# Altium integrated library Connector-SIL-THP.IntLib: 464 symbols (part 2 of 2)
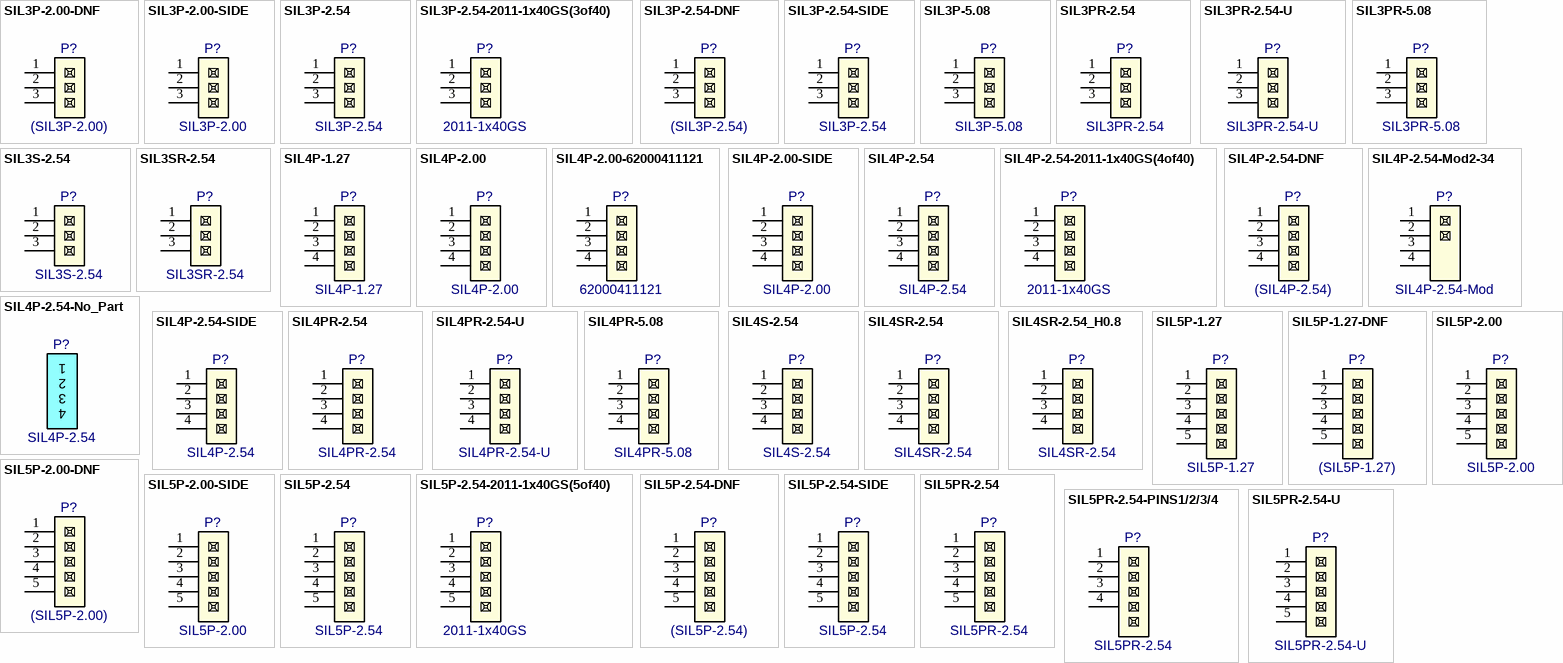
[diagram p12: symbols SIL3P-2.00-DNF to SIL5PR-2.54-U]

## SIL3SR-2.54
designator P?
Header SIL Female THP, 2.54mm Pitch Rt Angle; Manufacturer: Various; Package: SIL3SR-2.54; EDM-PN: *; Text2: *; Text1: *; Value: SIL3SR-2.54; SAAB PN: *; Part Number: SIL3SR-2.54
footprint SIL3SR-2.54 (SIL Strip Female 7.63x8.08mm 2.54mm)
pins: 1, 2, 3

## SIL4P-1.27
designator P?
Header SIL Male THP, 1.27mm Pitch; Manufacturer: Various; EDM-PN: CON459 (4 of 20); Package: SIL4P-1.27; Text2: *; Text1: *; Value: SIL4P-1.27; SAAB PN: *; Part Number: SIL4P-1.27
footprint SIL4P-1.27
pins: 1, 2, 3, 4

## SIL4P-2.00
designator P?
Header SIL Male THP, 2.00mm Pitch; Manufacturer: Various; Package: SIL4P-2.00; EDM-PN: *; Text2: *; Text1: *; Value: SIL4P-2.00; SAAB PN: *; Part Number: SIL4P-2.00
footprint SIL4P-2.00 (SIL4P 8.0x2.0mm)
pins: 1, 2, 3, 4

## SIL4P-2.00-62000411121
designator P?, comment 62000411121
Header SIL Male THP, 2.00mm Pitch; Manufacturer: Wurth; Package: 62000411121; EDM-PN: *; Text2: *; Text1: *; Value: 62000411121; SAAB PN: *; Part Number: 62000411121
footprint 62000411121 (SIL4P 8.0x2.0mm)
pins: 1, 2, 3, 4

## SIL4P-2.00-SIDE
designator P?  Part Number: SIL4P-2.00  (hidden comment: SIL4P-2.00-SIDE)
Header SIL Male THP, 2.00mm Pitch; Manufacturer: Various; Package: SIL4P-2.00-SIDE; EDM-PN: *; Text2: *; Text1: *; Value: SIL4P-2.00; SAAB PN: *
footprint SIL4P-2.00-SIDE (SIL4P 8.0x2.0mm)
pins: 1, 2, 3, 4

## SIL4P-2.54
designator P?
Header SIL Male THP, 2.54mm Pitch; Manufacturer: Various; EDM-PN: CON12; Package: SIL4P-2.54; Text2: *; Text1: *; Part Number: SIL4P-2.54; SAAB PN: *; Value: SIL4P-2.54
footprint SIL4P-2.54 (SIL Strip 2.54mm)
pins: 1, 2, 3, 4

## SIL4P-2.54-2011-1x40GS(4of40)
designator P?, comment Part Number: 2011-1x40GS  (hidden comment: 2011-1x40GS(4of40))
Header SIL Male THP, 2.54mm Pitch; Manufacturer: Protronix; EDM-PN: CON12; Package: SIL4P-2.54; Text2: *; Text1: *; SAAB PN: *; Value: 2011-1x40GS(4of40)
footprint SIL4P-2.54 (SIL Strip 2.54mm)
pins: 1, 2, 3, 4

## SIL4P-2.54-DNF
designator P?  value (SIL4P-2.54)  (hidden comment: SIL4P-2.54-DNF)
Header SIL Male THP, 2.54mm Pitch - Do not Fit; Manufacturer: Various; Part Number: DNF - SIL4P-2.54; EDM-PN: DNF; Package: SIL4P-2.54; Text2: *; Text1: *; SAAB PN: *
footprint SIL4P-2.54 (SIL Strip 2.54mm)
pins: 1, 2, 3, 4

## SIL4P-2.54-Mod2-34
designator P?, comment value SIL4P-2.54-Mod  (hidden comment: -Mod2-4)
Header SIL Male THP, 2.54mm Pitch - Mod; Manufacturer: Various; Part Number: SIL4P-2.54-Mod2-34; EDM-PN: CON12; Package: SIL4P-2.54; Text2: *; Text1: *; SAAB PN: *
footprint SIL4P-2.54-Mod2-34 (SIL Strip 2.54mm)
pins: 1, 2, 3, 4

## SIL4P-2.54-No_Part
designator P?, comment SIL4P-2.54  (mechanical)
Header SIL Male THP, 2.54mm Pitch; Manufacturer: Various; EDM-PN: CON12; Package: *; Text2: *; Text1: *; Part Number: SIL4P-2.54; SAAB PN: *; Value: SIL4P-2.54
text: 1; 2; 3; 4

## SIL4P-2.54-SIDE
designator P?  value SIL4P-2.54  (hidden comment: SIL4P-2.54-SIDE)
Header SIL Male THP, 2.54mm Pitch; Manufacturer: Various; EDM-PN: CON12; Package: SIL4P-2.54-SIDE; Text2: *; Text1: *; Part Number: SIL4P-2.54; SAAB PN: *
footprint SIL4P-2.54-EDGE (SIL Strip 2.54mm)
pins: 1, 2, 3, 4

## SIL4PR-2.54
designator P?
Header SIL Male 2.54mm Rt Angle; Manufacturer: Various; Package: SIL4PR-2.54; EDM-PN: *; Text2: *; Text1: *; Part Number: SIL4PR-2.54; SAAB PN: *; Value: SIL4PR-2.54
footprint SIL4PR-2.54 (SIL Male Rt Angle THP Header, 2.54mm Pitch)
pins: 1, 2, 3, 4

## SIL4PR-2.54-U
designator P?
Header SIL Male 2.54mm Rt Angle Type-U; Manufacturer: Various; Package: SIL4PR-2.54-U; EDM-PN: *; Text2: *; Text1: *; Part Number: SIL4PR-2.54-U; SAAB PN: *; Value: SIL4PR-2.54-U
footprint SIL4PR-2.54-U (SIL Male Rt Angle THP Header, 2.54mm Pitch Type-U)
pins: 1, 2, 3, 4

## SIL4PR-5.08
designator P?
Header SIL Male THP, 5.08mm Pitch Rt Angle; Manufacturer: Various; Package: SIL4PR-5.08; EDM-PN: *; Text2: *; Text1: *; Value: SIL4PR-5.08; SAAB PN: *; Part Number: SIL4PR-5.08
footprint SIL4PR-5.08
pins: 1, 2, 3, 4

## SIL4S-2.54
designator P?
Header SIL Female THP, 2.54mm Pitch; Manufacturer: Various; Package: SIL4S-2.54; EDM-PN: *; Text2: *; Text1: *; Value: SIL4S-2.54; Part Number: SIL4S-2.54; SAAB PN: *
footprint SIL4S-2.54 (SIL Female 2.54mm)
pins: 1, 2, 3, 4

## SIL4SR-2.54
designator P?
Header SIL Female THP, 2.54mm Pitch Rt Angle; Manufacturer: Various; Package: SIL4SR-2.54; EDM-PN: *; Text2: *; Text1: *; Value: SIL4SR-2.54; SAAB PN: *; Part Number: SIL4SR-2.54
footprint SIL4SR-2.54 (SIL Strip Female 7.63x8.08mm 2.54mm)
pins: 1, 2, 3, 4

## SIL4SR-2.54_H0.8
designator P?  Part Number: SIL4SR-2.54  (hidden comment: SIL4SR-2.54_H0.8)
Header SIL Female THP, 2.54mm Pitch Rt Angle; Manufacturer: Various; Package: SIL4SR-2.54-H0.8; EDM-PN: *; Text2: *; Text1: *; Value: SIL4SR-2.54; SAAB PN: *
footprint SIL4SR-2.54-H0.8 (SIL Strip Female 10.16x8.08mm 2.54mm)
pins: 1, 2, 3, 4

## SIL5P-1.27
designator P?
Header SIL Male THP, 1.27mm Pitch; Manufacturer: Various; EDM-PN: CON459 (5 of 20); Package: SIL5P-1.27; Text2: *; Text1: *; Value: SIL5P-1.27; SAAB PN: *; Part Number: SIL5P-1.27
footprint SIL5P-1.27
pins: 1, 2, 3, 4, 5

## SIL5P-1.27-DNF
designator P?  value (SIL5P-1.27)  (hidden comment: SIL5P-1.27-DNF)
Header SIL Male THP, 1.27mm Pitch - Do not Fit; Manufacturer: Various; Part Number: DNF - SIL5P-1.27; Package: SIL5P-1.27; EDM-PN: *; Text2: *; Text1: *; SAAB PN: *
footprint SIL5P-1.27
pins: 1, 2, 3, 4, 5

## SIL5P-2.00
designator P?
Header SIL Male THP, 2.00mm Pitch; Manufacturer: Various; Package: SIL5P-2.00; EDM-PN: *; Text2: *; Text1: *; Value: SIL5P-2.00; SAAB PN: *; Part Number: SIL5P-2.00
footprint SIL5P-2.00 (SIL5P 10.0x2.0mm)
pins: 1, 2, 3, 4, 5

## SIL5P-2.00-DNF
designator P?, comment value (SIL5P-2.00)  (hidden comment: SIL5P-2.00)  (no BOM)
Header SIL Male THP, 2.00mm Pitch; Manufacturer: Various; Part Number: DNF - SIL5P-2.00; Package: SIL5P-2.00; EDM-PN: *; Text2: *; Text1: *; SAAB PN: *
footprint SIL5P-2.00 (SIL5P 10.0x2.0mm)
pins: 1, 2, 3, 4, 5

## SIL5P-2.00-SIDE
designator P?  Part Number: SIL5P-2.00  (hidden comment: SIL5P-2.00-SIDE)
Header SIL Male THP, 2.00mm Pitch; Manufacturer: Various; Package: SIL5P-2.00-SIDE; EDM-PN: *; Text2: *; Text1: *; Value: SIL5P-2.00; SAAB PN: *
footprint SIL5P-2.00-SIDE (SIL5P 10.0x2.0mm)
pins: 1, 2, 3, 4, 5

## SIL5P-2.54
designator P?
Header SIL Male THP, 2.54mm Pitch; Manufacturer: Various; EDM-PN: CON12; Package: SIL5P-2.54; Text2: *; Text1: *; Value: SIL5P-2.54; SAAB PN: *; Part Number: SIL5P-2.54
footprint SIL5P-2.54 (SIL Strip 2.54mm)
pins: 1, 2, 3, 4, 5

## SIL5P-2.54-2011-1x40GS(5of40)
designator P?, comment value 2011-1x40GS  (hidden comment: 2011-1x40GS(5of40))
Header SIL Male THP, 2.54mm Pitch; Manufacturer: Protronix; EDM-PN: CON12; Package: SIL5P-2.54; Text2: *; Text1: *; SAAB PN: *; Part Number: 2011-1x40GS(5of40)
footprint SIL5P-2.54 (SIL Strip 2.54mm)
pins: 1, 2, 3, 4, 5

## SIL5P-2.54-DNF
designator P?  value (SIL5P-2.54)  (hidden comment: SIL5P-2.54-DNF)
Header SIL Male THP, 2.54mm Pitch - Do not Fit; Manufacturer: Various; Part Number: DNF - SIL5P-2.54; EDM-PN: DNF; Package: SIL5P-2.54; Text2: *; Text1: *; SAAB PN: *
footprint SIL5P-2.54 (SIL Strip 2.54mm)
pins: 1, 2, 3, 4, 5

## SIL5P-2.54-SIDE
designator P?  Part Number: SIL5P-2.54  (hidden comment: SIL5P-2.54-SIDE)
Header SIL Male THP, 2.54mm Pitch; Manufacturer: Various; EDM-PN: CON12; Package: SIL5P-2.54-SIDE; Text2: *; Text1: *; Value: SIL5P-2.54; SAAB PN: *
footprint SIL5P-2.54-EDGE (SIL Strip 2.54mm)
pins: 1, 2, 3, 4, 5

## SIL5PR-2.54
designator P?
Header SIL Male 2.54mm Rt Angle; Manufacturer: Various; Package: SIL5PR-2.54; EDM-PN: *; Text2: *; Text1: *; Part Number: SIL5PR-2.54; SAAB PN: *; Value: SIL5PR-2.54
footprint SIL5PR-2.54 (SIL Male Rt Angle THP Header, 2.54mm Pitch)
pins: 1, 2, 3, 4, 5

## SIL5PR-2.54-PINS1/2/3/4
designator P?, comment SIL5PR-2.54
Header SIL Male 2.54mm Rt Angle; Manufacturer: Various; Package: SIL5PR-2.54; EDM-PN: *; Text2: *; Text1: *; Part Number: SIL5PR-2.54; SAAB PN: *; Value: SIL5PR-2.54
footprint SIL5PR-2.54-1234 (SIL Male Rt Angle THP Header, 2.54mm Pitch)
pins: 1, 2, 3, 4

## SIL5PR-2.54-U
designator P?
Header SIL Male 2.54mm Rt Angle Type-U; Manufacturer: Various; Package: SIL5PR-2.54-U; EDM-PN: *; Text2: *; Text1: *; Part Number: SIL5PR-2.54-U; SAAB PN: *; Value: SIL5PR-2.54-U
footprint SIL5PR-2.54-U (SIL Male Rt Angle THP Header, 2.54mm Pitch Type-U)
pins: 1, 2, 3, 4, 5

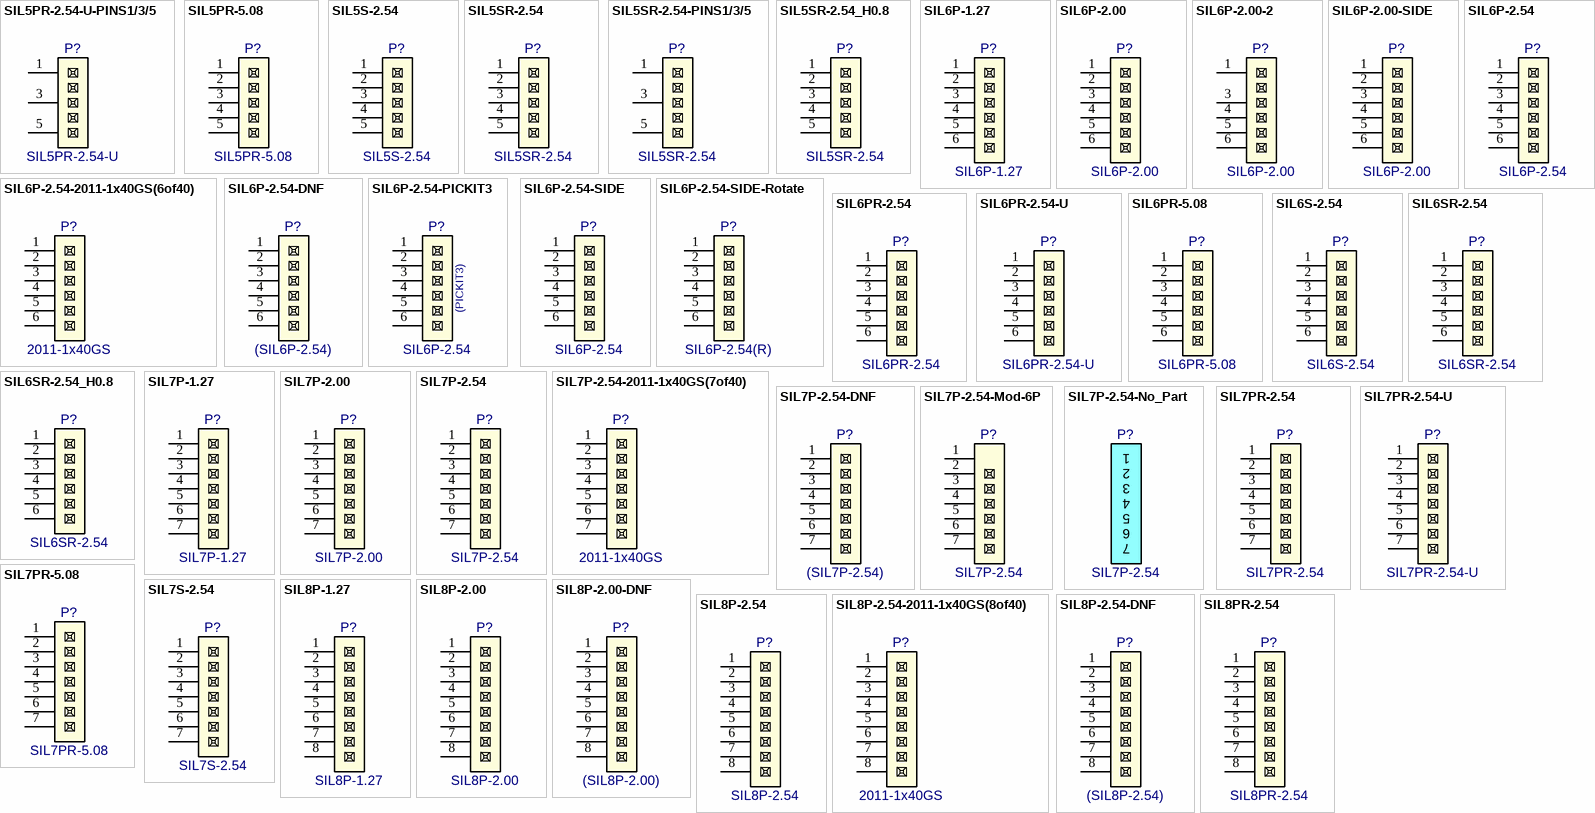
[diagram p7: symbols SIL5PR-2.54-U-PINS1/3/5 to SIL8PR-2.54]

## SIL5PR-2.54-U-PINS1/3/5
designator P?, comment SIL5PR-2.54-U
Header SIL Male 2.54mm Rt Angle Type-U (Remove Pins 2 and 4); Manufacturer: Various; Package: SIL5PR-2.54-U-135; EDM-PN: *; Text2: *; Text1: *; Part Number: SIL5PR-2.54-U; SAAB PN: *; Value: SIL5PR-2.54-U
footprint SIL5PR-2.54-U-135 (SIL Male Rt Angle THP Header, 2.54mm Pitch Type-U)
pins: 1, 3, 5

## SIL5PR-5.08
designator P?
Header SIL Male THP, 5.08mm Pitch Rt Angle; Manufacturer: Various; Package: SIL5PR-5.08; EDM-PN: *; Text2: *; Text1: *; Value: SIL5PR-5.08; Part Number: SIL5PR-5.08; SAAB PN: *
footprint SIL5PR-5.08
pins: 1, 2, 3, 4, 5

## SIL5S-2.54
designator P?
Header SIL Female THP, 2.54mm Pitch; Manufacturer: Various; Package: SIL5S-2.54; EDM-PN: *; Text2: *; Text1: *; Value: SIL5S-2.54; SAAB PN: *; Part Number: SIL5S-2.54
footprint SIL5S-2.54 (SIL Female 2.54mm)
pins: 1, 2, 3, 4, 5

## SIL5SR-2.54
designator P?
Header SIL Female THP, 2.54mm Pitch Rt Angle; Manufacturer: Various; Package: SIL5SR-2.54; EDM-PN: *; Text2: *; Text1: *; Value: SIL5SR-2.54; SAAB PN: *; Part Number: SIL5SR-2.54
footprint SIL5SR-2.54 (SIL Strip Female 7.63x8.08mm 2.54mm)
pins: 1, 2, 3, 4, 5

## SIL5SR-2.54-PINS1/3/5
designator P?, comment Part Number: SIL5SR-2.54  (hidden comment: SIL3SR-2.54)
Header SIL Female THP, 2.54mm Pitch Rt Angle (Remove Pins 2 and 4); Manufacturer: Various; Value: SIL5SR-2.54; Package: SIL5SR-2.54-135; EDM-PN: *; Text2: *; Text1: *; SAAB PN: *
footprint SIL5SR-2.54-135 (SIL Strip Female 7.63x8.08mm 2.54mm)
pins: 1, 3, 5

## SIL5SR-2.54_H0.8
designator P?  Part Number: SIL5SR-2.54  (hidden comment: SIL5SR-2.54_H0.8)
Header SIL Female THP, 2.54mm Pitch Rt Angle; Manufacturer: Various; Package: SIL5SR-2.54-H0.8; EDM-PN: *; Text2: *; Text1: *; Value: SIL5SR-2.54; SAAB PN: *
footprint SIL5SR-2.54-H0.8 (SIL Strip Female 7.63x8.08mm 2.54mm)
pins: 1, 2, 3, 4, 5

## SIL6P-1.27
designator P?
Header SIL Male THP, 1.27mm Pitch; Manufacturer: Various; EDM-PN: CON459 (6 of 20); Package: SIL6P-1.27; Text2: *; Text1: *; Value: SIL6P-1.27; SAAB PN: *; Part Number: SIL6P-1.27
footprint SIL6P-1.27
pins: 1, 2, 3, 4, 5, 6

## SIL6P-2.00
designator P?
Header SIL Male THP, 2.00mm Pitch; Manufacturer: Various; Package: SIL6P-2.00; EDM-PN: *; Text2: *; Text1: *; Value: SIL6P-2.00; SAAB PN: *; Part Number: SIL6P-2.00
footprint SIL6P-2.00 (SIL6P 12.0x2.0mm)
pins: 1, 2, 3, 4, 5, 6

## SIL6P-2.00-2
designator P?  Part Number: SIL6P-2.00  (hidden comment: SIL6P-2.00-2)
Header SIL Male THP, 2.00mm Pitch; Manufacturer: Various; Package: SIL6P-2.00-2; EDM-PN: *; Text2: *; Text1: *; Value: SIL6P-2.00; SAAB PN: *
footprint SIL6P-2.00-2 (SIL6P 12.0x2.0mm no pin 2)
pins: 1, 3, 4, 5, 6

## SIL6P-2.00-SIDE
designator P?  Part Number: SIL6P-2.00  (hidden comment: SIL6P-2.00-SIDE)
Header SIL Male THP, 2.00mm Pitch; Manufacturer: Various; Package: SIL6P-2.00-SIDE; EDM-PN: *; Text2: *; Text1: *; Value: SIL6P-2.00; SAAB PN: *
footprint SIL6P-2.00-SIDE (SIL6P 12.0x2.0mm)
pins: 1, 2, 3, 4, 5, 6

## SIL6P-2.54
designator P?
Header SIL Male THP, 2.54mm Pitch; Manufacturer: Various; EDM-PN: CON12; Package: SIL6P-2.54; Text2: *; Text1: *; Value: SIL6P-2.54; SAAB PN: *; Part Number: SIL6P-2.54
footprint SIL6P-2.54 (SIL Strip 2.54mm)
pins: 1, 2, 3, 4, 5, 6

## SIL6P-2.54-2011-1x40GS(6of40)
designator P?, comment value 2011-1x40GS  (hidden comment: 2011-1x40GS(6of40))
Header SIL Male THP, 2.54mm Pitch; Manufacturer: Protronix; EDM-PN: CON12; Package: SIL6P-2.54; Text2: *; Text1: *; SAAB PN: *; Part Number: 2011-1x40GS(6of40)
footprint SIL6P-2.54 (SIL Strip 2.54mm)
pins: 1, 2, 3, 4, 5, 6

## SIL6P-2.54-DNF
designator P?  value (SIL6P-2.54)  (hidden comment: SIL6P-2.54-DNF)
Header SIL Male THP, 2.54mm Pitch - Do not Fit; Manufacturer: Various; Part Number: DNF - SIL6P-2.54; EDM-PN: CON12; Package: SIL6P-2.54; Text2: *; Text1: *; SAAB PN: *
footprint SIL6P-2.54 (SIL Strip 2.54mm)
pins: 1, 2, 3, 4, 5, 6

## SIL6P-2.54-PICKIT3
designator P?  value SIL6P-2.54  Text1: (PICKIT3)  (hidden comment: SIL6P-2.54-PICKIT3)
Header SIL Male THP, 2.54mm Pitch; Manufacturer: Various; EDM-PN: CON12; Package: SIL6P-2.54-PICKIT3; Text2: *; Part Number: SIL6P-2.54; SAAB PN: *
footprint SIL6P-2.54-PICKIT3 (SIL Strip 2.54mm)
pins: 1, 2, 3, 4, 5, 6

## SIL6P-2.54-SIDE
designator P?  Part Number: SIL6P-2.54  (hidden comment: SIL6P-2.54-SIDE)
Header SIL Male THP, 2.54mm Pitch; Manufacturer: Various; EDM-PN: CON12; Package: SIL6P-2.54-SIDE; Text2: *; Text1: *; Value: SIL6P-2.54; SAAB PN: *
footprint SIL6P-2.54-EDGE (SIL Strip 2.54mm)
pins: 1, 2, 3, 4, 5, 6

## SIL6P-2.54-SIDE-Rotate
designator P?  Part Number: SIL6P-2.54(R)  (hidden comment: SIL6P-2.54-SIDE-Rotate)
Header SIL Male THP, 2.54mm Pitch; Manufacturer: Various; EDM-PN: CON12; Value: SIL6P-2.54(R); Package: SIL6P-2.54-SIDE-ROT; Text2: *; Text1: *; SAAB PN: *
footprint SIL6P-2.54-EDGE-ROT (SIL Strip 2.54mm)
pins: 1, 2, 3, 4, 5, 6

## SIL6PR-2.54
designator P?
Header SIL Male 2.54mm Rt Angle; Manufacturer: Various; Package: SIL6PR-2.54; EDM-PN: *; Text2: *; Text1: *; Part Number: SIL6PR-2.54; Value: SIL6PR-2.54; SAAB PN: *
footprint SIL6PR-2.54 (SIL Male Rt Angle THP Header, 2.54mm Pitch)
pins: 1, 2, 3, 4, 5, 6

## SIL6PR-2.54-U
designator P?
Header SIL Male 2.54mm Rt Angle Type-U; Manufacturer: Various; Package: SIL6PR-2.54-U; EDM-PN: *; Text2: *; Text1: *; Part Number: SIL6PR-2.54-U; SAAB PN: *; Value: SIL6PR-2.54-U
footprint SIL6PR-2.54-U (SIL Male Rt Angle THP Header, 2.54mm Pitch Type-U)
pins: 1, 2, 3, 4, 5, 6

## SIL6PR-5.08
designator P?
Header SIL Male THP, 5.08mm Pitch Rt Angle; Manufacturer: Various; Package: SIL6PR-5.08; EDM-PN: *; Text2: *; Text1: *; Value: SIL6PR-5.08; Part Number: SIL6PR-5.08; SAAB PN: *
footprint SIL6PR-5.08
pins: 1, 2, 3, 4, 5, 6

## SIL6S-2.54
designator P?
Header SIL Female THP, 2.54mm Pitch; Manufacturer: Various; Package: SIL6S-2.54; EDM-PN: *; Text2: *; Text1: *; Value: SIL6S-2.54; SAAB PN: *; Part Number: SIL6S-2.54
footprint SIL6S-2.54 (SIL Female 2.54mm)
pins: 1, 2, 3, 4, 5, 6

## SIL6SR-2.54
designator P?
Header SIL Female THP, 2.54mm Pitch Rt Angle; Manufacturer: Various; Package: SIL6SR-2.54; EDM-PN: *; Text2: *; Text1: *; Value: SIL6SR-2.54; SAAB PN: *; Part Number: SIL6SR-2.54
footprint SIL6SR-2.54 (SIL Strip Female 12.7x8.08mm 2.54mm)
pins: 1, 2, 3, 4, 5, 6

## SIL6SR-2.54_H0.8
designator P?  Part Number: SIL6SR-2.54  (hidden comment: SIL6SR-2.54_H0.8)
Header SIL Female THP, 2.54mm Pitch Rt Angle; Manufacturer: Various; Package: SIL6SR-2.54-H0.8; EDM-PN: *; Text2: *; Text1: *; Value: SIL6SR-2.54; SAAB PN: *
footprint SIL6SR-2.54-H0.8 (SIL Strip Female 12.7x8.08mm 2.54mm)
pins: 1, 2, 3, 4, 5, 6

## SIL7P-1.27
designator P?
Header SIL Male THP, 1.27mm Pitch; Manufacturer: Various; EDM-PN: CON459 (7 of 20); Package: SIL7P-1.27; Text2: *; Text1: *; Value: SIL7P-1.27; SAAB PN: *; Part Number: SIL7P-1.27
footprint SIL7P-1.27
pins: 1, 2, 3, 4, 5, 6, 7

## SIL7P-2.00
designator P?
Header SIL Male THP, 2.00mm Pitch; Manufacturer: Various; Package: SIL7P-2.00; EDM-PN: *; Text2: *; Text1: *; Value: SIL7P-2.00; Part Number: SIL7P-2.00; SAAB PN: *
footprint SIL7P-2.00 (SIL7P 14.0x2.0mm)
pins: 1, 2, 3, 4, 5, 6, 7

## SIL7P-2.54
designator P?
Header SIL Male THP, 2.54mm Pitch; Manufacturer: Various; EDM-PN: CON12; Package: SIL7P-2.54; Text2: *; Text1: *; Value: SIL7P-2.54; SAAB PN: *; Part Number: SIL7P-2.54
footprint SIL7P-2.54 (SIL Strip 2.54mm)
pins: 1, 2, 3, 4, 5, 6, 7

## SIL7P-2.54-2011-1x40GS(7of40)
designator P?, comment value 2011-1x40GS  (hidden comment: 2011-1x40GS(7of40))
Header SIL Male THP, 2.54mm Pitch; Manufacturer: Protronix; EDM-PN: CON12; Package: SIL7P-2.54; Text2: *; Text1: *; SAAB PN: *; Part Number: 2011-1x40GS(7of40)
footprint SIL7P-2.54 (SIL Strip 2.54mm)
pins: 1, 2, 3, 4, 5, 6, 7

## SIL7P-2.54-DNF
designator P?  value (SIL7P-2.54)  (hidden comment: SIL7P-2.54-DNF)
Header SIL Male THP, 2.54mm Pitch - Do not Fit; Manufacturer: Various; Part Number: DNF - SIL7P-2.54; Package: SIL7P-2.54; EDM-PN: *; Text2: *; Text1: *; SAAB PN: *
footprint SIL7P-2.54 (SIL Strip 2.54mm)
pins: 1, 2, 3, 4, 5, 6, 7

## SIL7P-2.54-Mod-6P
designator P?  Part Number: SIL7P-2.54  (hidden comment: SIL7P-2.54-Mod-6P)
Header SIL Male THP, 2.54mm Pitch - Pin 1 Not Used; Manufacturer: Various; EDM-PN: CON12; Package: SIL7P-2.54-M6; Text2: *; Text1: *; Value: SIL7P-2.54; SAAB PN: *
footprint SIL7P-2.54-MOD6 (SIL Strip 2.54mm)
pins: 1, 2, 3, 4, 5, 6, 7

## SIL7P-2.54-No_Part
designator P?, comment SIL7P-2.54  (mechanical)
Header SIL Male THP, 2.54mm Pitch; Manufacturer: Various; EDM-PN: CON12; Package: *; Text2: *; Text1: *; Value: SIL7P-2.54; SAAB PN: *; Part Number: SIL7P-2.54
text: 1; 2; 3; 4; 5; 6; 7

## SIL7PR-2.54
designator P?
Header SIL Male 2.54mm Rt Angle; Manufacturer: Various; Package: SIL7PR-2.54; EDM-PN: *; Text2: *; Text1: *; Part Number: SIL7PR-2.54; Value: SIL7PR-2.54; SAAB PN: *
footprint SIL7PR-2.54 (SIL Male Rt Angle THP Header, 2.54mm Pitch)
pins: 1, 2, 3, 4, 5, 6, 7

## SIL7PR-2.54-U
designator P?
Header SIL Male 2.54mm Rt Angle Type-U; Manufacturer: Various; Package: SIL7PR-2.54-U; EDM-PN: *; Text2: *; Text1: *; Part Number: SIL7PR-2.54-U; Value: SIL7PR-2.54-U; SAAB PN: *
footprint SIL7PR-2.54-U (SIL Male Rt Angle THP Header, 2.54mm Pitch Type-U)
pins: 1, 2, 3, 4, 5, 6, 7

## SIL7PR-5.08
designator P?
Header SIL Male THP, 5.08mm Pitch Rt Angle; Manufacturer: Various; Package: SIL7PR-5.08; EDM-PN: *; Text2: *; Text1: *; Value: SIL7PR-5.08; Part Number: SIL7PR-5.08; SAAB PN: *
footprint SIL7PR-5.08
pins: 1, 2, 3, 4, 5, 6, 7

## SIL7S-2.54
designator P?
Header SIL Female THP, 2.54mm Pitch; Manufacturer: Various; Package: SIL7S-2.54; EDM-PN: *; Text2: *; Text1: *; Value: SIL7S-2.54; Part Number: SIL7S-2.54; SAAB PN: *
footprint SIL7S-2.54 (SIL Female 2.54mm)
pins: 1, 2, 3, 4, 5, 6, 7

## SIL8P-1.27
designator P?
Header SIL Male THP, 1.27mm Pitch; Manufacturer: Various; EDM-PN: CON459 (8 of 20); Package: SIL8P-1.27; Text2: *; Text1: *; Value: SIL8P-1.27; SAAB PN: *; Part Number: SIL8P-1.27
footprint SIL8P-1.27
pins: 1, 2, 3, 4, 5, 6, 7, 8

## SIL8P-2.00
designator P?
Header SIL Male THP, 2.00mm Pitch; Manufacturer: Various; Package: SIL8P-2.00; EDM-PN: *; Text2: *; Text1: *; Value: SIL8P-2.00; Part Number: SIL8P-2.00; SAAB PN: *
footprint SIL8P-2.00 (SIL8P 16.0x2.0mm)
pins: 1, 2, 3, 4, 5, 6, 7, 8

## SIL8P-2.00-DNF
designator P?  value (SIL8P-2.00)  (hidden comment: SIL8P-2.00-DNF)
Header SIL Male THP, 2.00mm Pitch - Do not Fit; Manufacturer: Various; Part Number: DNF - SIL8P-2.00; Package: SIL8P-2.00; EDM-PN: *; Text2: *; Text1: *; SAAB PN: *
footprint SIL8P-2.00 (SIL8P 16.0x2.0mm)
pins: 1, 2, 3, 4, 5, 6, 7, 8

## SIL8P-2.54
designator P?
Header SIL Male THP, 2.54mm Pitch; Manufacturer: Various; EDM-PN: CON12; Package: SIL8P-2.54; Text2: *; Text1: *; Value: SIL8P-2.54; SAAB PN: *; Part Number: SIL8P-2.54
footprint SIL8P-2.54 (SIL Strip 2.54mm)
pins: 1, 2, 3, 4, 5, 6, 7, 8

## SIL8P-2.54-2011-1x40GS(8of40)
designator P?, comment value 2011-1x40GS  (hidden comment: 2011-1x40GS(8of40))
Header SIL Male THP, 2.54mm Pitch; Manufacturer: Protronix; EDM-PN: CON12; Package: SIL8P-2.54; Text2: *; Text1: *; SAAB PN: *; Part Number: 2011-1x40GS(8of40)
footprint SIL8P-2.54 (SIL Strip 2.54mm)
pins: 1, 2, 3, 4, 5, 6, 7, 8

## SIL8P-2.54-DNF
designator P?, comment value (SIL8P-2.54)  (hidden comment: SIL8P-2.54)
Header SIL Male THP, 2.54mm Pitch - Do not Fit; Manufacturer: Various; Part Number: DNF - SIL8P-2.54; EDM-PN: CON12; Package: SIL8P-2.54; Text2: *; Text1: *; SAAB PN: *
footprint SIL8P-2.54 (SIL Strip 2.54mm)
pins: 1, 2, 3, 4, 5, 6, 7, 8

## SIL8PR-2.54
designator P?
Header SIL Male 2.54mm Rt Angle; Manufacturer: Various; Package: SIL8PR-2.54; EDM-PN: *; Text2: *; Text1: *; Part Number: SIL8PR-2.54; Value: SIL8PR-2.54; SAAB PN: *
footprint SIL8PR-2.54 (SIL Male Rt Angle THP Header, 2.54mm Pitch)
pins: 1, 2, 3, 4, 5, 6, 7, 8

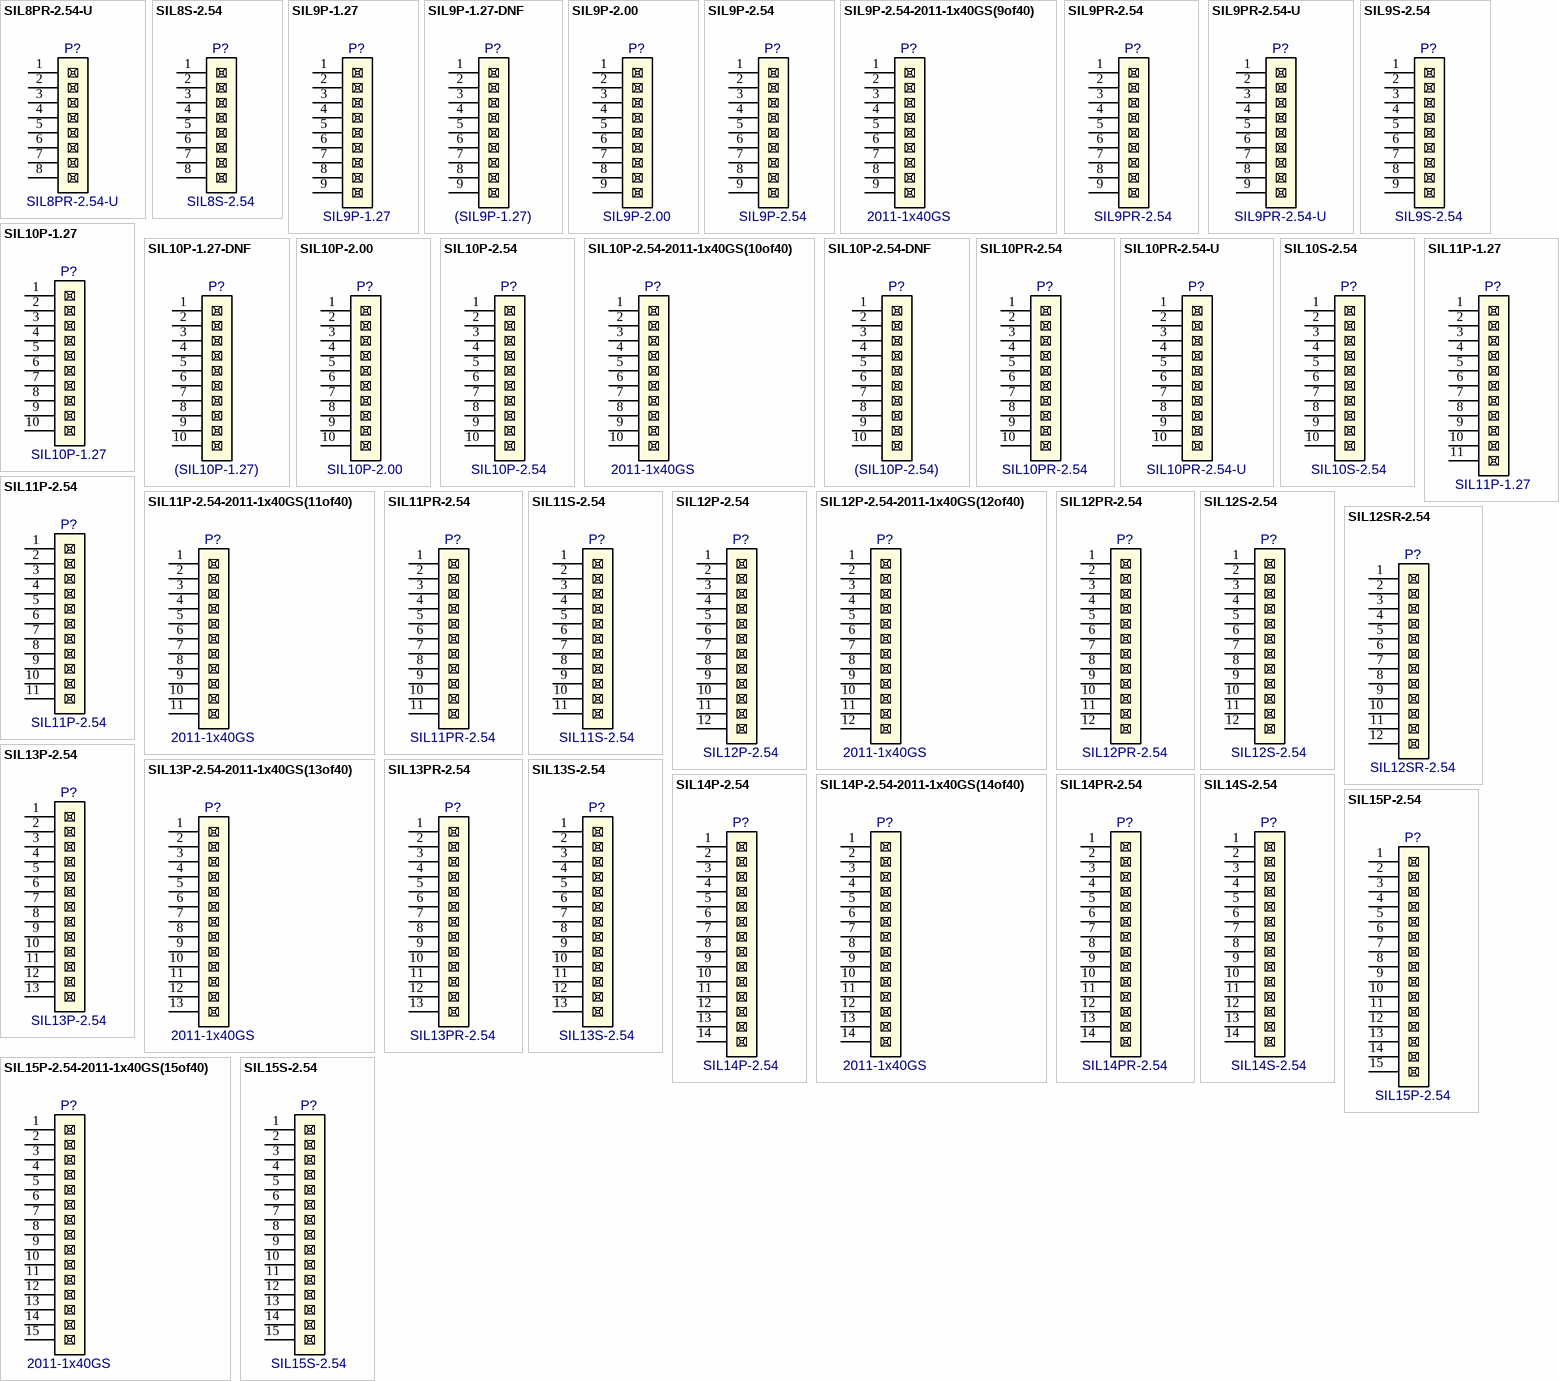
[diagram p8: symbols SIL8PR-2.54-U to SIL15S-2.54]

## SIL8PR-2.54-U
designator P?
Header SIL Male 2.54mm Rt Angle Type-U; Manufacturer: Various; Package: SIL8PR-2.54-U; EDM-PN: *; Text2: *; Text1: *; Part Number: SIL8PR-2.54-U; Value: SIL8PR-2.54-U; SAAB PN: *
footprint SIL8PR-2.54-U (SIL Male Rt Angle THP Header, 2.54mm Pitch Type-U)
pins: 1, 2, 3, 4, 5, 6, 7, 8

## SIL8S-2.54
designator P?
Header SIL Female THP, 2.54mm Pitch; Manufacturer: Various; Package: SIL8S-2.54; EDM-PN: *; Text2: *; Text1: *; Value: SIL8S-2.54; Part Number: SIL8S-2.54; SAAB PN: *
footprint SIL8S-2.54 (SIL Female 2.54mm)
pins: 1, 2, 3, 4, 5, 6, 7, 8

## SIL9P-1.27
designator P?
Header SIL Male THP, 1.27mm Pitch; Manufacturer: Various; EDM-PN: CON459 (9 of 20); Package: SIL9P-1.27; Text2: *; Text1: *; Value: SIL9P-1.27; SAAB PN: *; Part Number: SIL9P-1.27
footprint SIL9P-1.27
pins: 1, 2, 3, 4, 5, 6, 7, 8, 9

## SIL9P-1.27-DNF
designator P?  value (SIL9P-1.27)  (hidden comment: SIL9P-1.27-DNF)
Header SIL Male THP, 1.27mm Pitch - Do not Fit; Manufacturer: Various; Part Number: DNF - SIL9P-1.27; Package: SIL9P-1.27; EDM-PN: *; Text2: *; Text1: *; SAAB PN: *
footprint SIL9P-1.27
pins: 1, 2, 3, 4, 5, 6, 7, 8, 9

## SIL9P-2.00
designator P?
Header SIL Male THP, 2.00mm Pitch; Manufacturer: Various; Package: SIL9P-2.00; EDM-PN: *; Text2: *; Text1: *; Value: SIL9P-2.00; Part Number: SIL9P-2.00; SAAB PN: *
footprint SIL9P-2.00 (SIL9P 18.0x2.0mm)
pins: 1, 2, 3, 4, 5, 6, 7, 8, 9

## SIL9P-2.54
designator P?
Header SIL Male THP, 2.54mm Pitch; Manufacturer: Various; EDM-PN: CON12; Package: SIL9P-2.54; Text2: *; Text1: *; Value: SIL9P-2.54; SAAB PN: *; Part Number: SIL9P-2.54
footprint SIL9P-2.54 (SIL Strip 2.54mm)
pins: 1, 2, 3, 4, 5, 6, 7, 8, 9

## SIL9P-2.54-2011-1x40GS(9of40)
designator P?, comment value 2011-1x40GS  (hidden comment: 2011-1x40GS(9of40))
Header SIL Male THP, 2.54mm Pitch; Manufacturer: Protronix; EDM-PN: CON12; Package: SIL9P-2.54; Text2: *; Text1: *; SAAB PN: *; Part Number: 2011-1x40GS(9of40)
footprint SIL9P-2.54 (SIL Strip 2.54mm)
pins: 1, 2, 3, 4, 5, 6, 7, 8, 9

## SIL9PR-2.54
designator P?
Header SIL Male 2.54mm Rt Angle; Manufacturer: Various; Package: SIL9PR-2.54; EDM-PN: *; Text2: *; Text1: *; Part Number: SIL9PR-2.54; Value: SIL9PR-2.54; SAAB PN: *
footprint SIL9PR-2.54 (SIL Male Rt Angle THP Header, 2.54mm Pitch)
pins: 1, 2, 3, 4, 5, 6, 7, 8, 9

## SIL9PR-2.54-U
designator P?
Header SIL Male 2.54mm Rt Angle Type-U; Manufacturer: Various; Package: SIL9PR-2.54-U; EDM-PN: *; Text2: *; Text1: *; Part Number: SIL9PR-2.54-U; SAAB PN: *; Value: SIL9PR-2.54-U
footprint SIL9PR-2.54-U (SIL Male Rt Angle THP Header, 2.54mm Pitch Type-U)
pins: 1, 2, 3, 4, 5, 6, 7, 8, 9

## SIL9S-2.54
designator P?
Header SIL Female THP, 2.54mm Pitch; Manufacturer: Various; Package: SIL9S-2.54; EDM-PN: *; Text2: *; Text1: *; Value: SIL9S-2.54; Part Number: SIL9S-2.54; SAAB PN: *
footprint SIL9S-2.54 (SIL Female 2.54mm)
pins: 1, 2, 3, 4, 5, 6, 7, 8, 9

## SIL10P-1.27
designator P?
Header SIL Male THP, 1.27mm Pitch; Manufacturer: Various; EDM-PN: CON459 (10 of 20); Package: SIL10P-1.27; Text2: *; Text1: *; Value: SIL10P-1.27; SAAB PN: *; Part Number: SIL10P-1.27
footprint SIL10P-1.27
pins: 1, 2, 3, 4, 5, 6, 7, 8, 9, 10

## SIL10P-1.27-DNF
designator P?  value (SIL10P-1.27)  (hidden comment: SIL10P-1.27-DNF)
Header SIL Male THP, 1.27mm Pitch - Do not Fit; Manufacturer: Various; Part Number: DNF - SIL10P-1.27; Package: SIL10P-1.27; EDM-PN: *; Text2: *; Text1: *; SAAB PN: *
footprint SIL10P-1.27
pins: 1, 2, 3, 4, 5, 6, 7, 8, 9, 10

## SIL10P-2.00
designator P?
Header SIL Male THP, 2.00mm Pitch; Manufacturer: Various; Package: SIL10P-2.00; EDM-PN: *; Text2: *; Text1: *; Value: SIL10P-2.00; Part Number: SIL10P-2.00; SAAB PN: *
footprint SIL10P-2.00 (SIL10P 20.0x2.0mm)
pins: 1, 2, 3, 4, 5, 6, 7, 8, 9, 10

## SIL10P-2.54
designator P?
Header SIL Male THP, 2.54mm Pitch; Manufacturer: Various; EDM-PN: CON12; Package: SIL10P-2.54; Text2: *; Text1: *; Value: SIL10P-2.54; SAAB PN: *; Part Number: SIL10P-2.54
footprint SIL10P-2.54 (SIL Strip 2.54mm)
pins: 1, 2, 3, 4, 5, 6, 7, 8, 9, 10

## SIL10P-2.54-2011-1x40GS(10of40)
designator P?, comment value 2011-1x40GS  (hidden comment: 2011-1x40GS(10of40))
Header SIL Male THP, 2.54mm Pitch; Manufacturer: Protronix; EDM-PN: CON12; Package: SIL10P-2.54; Text2: *; Text1: *; SAAB PN: *; Part Number: 2011-1x40GS(10of40)
footprint SIL10P-2.54 (SIL Strip 2.54mm)
pins: 1, 2, 3, 4, 5, 6, 7, 8, 9, 10

## SIL10P-2.54-DNF
designator P?, comment value (SIL10P-2.54)  (hidden comment: SIL10P-2.54)
Header SIL Male THP, 2.54mm Pitch - Do not Fit; Manufacturer: Various; Part Number: DNF - SIL10P-2.54; EDM-PN: CON12; Package: SIL10P-2.54; Text2: *; Text1: *; SAAB PN: *
footprint SIL10P-2.54 (SIL Strip 2.54mm)
pins: 1, 2, 3, 4, 5, 6, 7, 8, 9, 10

## SIL10PR-2.54
designator P?
Header SIL Male 2.54mm Rt Angle; Manufacturer: Various; Package: SIL10PR-2.54; EDM-PN: *; Text2: *; Text1: *; Part Number: SIL10PR-2.54; Value: SIL10PR-2.54; SAAB PN: *
footprint SIL10PR-2.54 (SIL Male Rt Angle THP Header, 2.54mm Pitch)
pins: 1, 2, 3, 4, 5, 6, 7, 8, 9, 10

## SIL10PR-2.54-U
designator P?
Header SIL Male 2.54mm Rt Angle Type-U; Manufacturer: Various; Package: SIL10PR-2.54-U; EDM-PN: *; Text2: *; Text1: *; Part Number: SIL10PR-2.54-U; Value: SIL10PR-2.54-U; SAAB PN: *
footprint SIL10PR-2.54-U (SIL Male Rt Angle THP Header, 2.54mm Pitch Type-U)
pins: 1, 2, 3, 4, 5, 6, 7, 8, 9, 10

## SIL10S-2.54
designator P?
Header SIL Female THP, 2.54mm Pitch; Manufacturer: Various; Package: SIL10S-2.54; EDM-PN: *; Text2: *; Text1: *; Value: SIL10S-2.54; SAAB PN: *; Part Number: SIL10S-2.54
footprint SIL10S-2.54 (SIL Female 2.54mm)
pins: 1, 2, 3, 4, 5, 6, 7, 8, 9, 10

## SIL11P-1.27
designator P?
Header SIL Male THP, 1.27mm Pitch; Manufacturer: Various; EDM-PN: CON459 (11 of 20); Package: SIL11P-1.27; Text2: *; Text1: *; Value: SIL11P-1.27; SAAB PN: *; Part Number: SIL11P-1.27
footprint SIL11P-1.27
pins: 1, 2, 3, 4, 5, 6, 7, 8, 9, 10, 11

## SIL11P-2.54
designator P?
Header SIL Male THP, 2.54mm Pitch; Manufacturer: Various; EDM-PN: CON12; Package: SIL11P-2.54; Text2: *; Text1: *; Value: SIL11P-2.54; SAAB PN: *; Part Number: SIL11P-2.54
footprint SIL11P-2.54 (SIL Strip 2.54mm)
pins: 1, 2, 3, 4, 5, 6, 7, 8, 9, 10, 11

## SIL11P-2.54-2011-1x40GS(11of40)
designator P?, comment value 2011-1x40GS  (hidden comment: 2011-1x40GS(11of40))
Header SIL Male THP, 2.54mm Pitch; Manufacturer: Protronix; EDM-PN: CON12; Package: SIL11P-2.54; Text2: *; Text1: *; SAAB PN: *; Part Number: 2011-1x40GS(11of40)
footprint SIL11P-2.54 (SIL Strip 2.54mm)
pins: 1, 2, 3, 4, 5, 6, 7, 8, 9, 10, 11

## SIL11PR-2.54
designator P?
Header SIL Male 2.54mm Rt Angle; Manufacturer: Various; Package: SIL11PR-2.54; EDM-PN: *; Text2: *; Text1: *; Part Number: SIL11PR-2.54; Value: SIL11PR-2.54; SAAB PN: *
footprint SIL11PR-2.54 (SIL Male Rt Angle THP Header, 2.54mm Pitch)
pins: 1, 2, 3, 4, 5, 6, 7, 8, 9, 10, 11

## SIL11S-2.54
designator P?
Header SIL Female THP, 2.54mm Pitch; Manufacturer: Various; Package: SIL11S-2.54; EDM-PN: *; Text2: *; Text1: *; Value: SIL11S-2.54; Part Number: SIL11S-2.54; SAAB PN: *
footprint SIL11S-2.54 (SIL Female 2.54mm)
pins: 1, 2, 3, 4, 5, 6, 7, 8, 9, 10, 11

## SIL12P-2.54
designator P?
Header SIL Male THP, 2.54mm Pitch; Manufacturer: Various; EDM-PN: CON12; Package: SIL12P-2.54; Text2: *; Text1: *; Value: SIL12P-2.54; SAAB PN: *; Part Number: SIL12P-2.54
footprint SIL12P-2.54 (SIL Strip 2.54mm)
pins: 1, 2, 3, 4, 5, 6, 7, 8, 9, 10, 11, 12

## SIL12P-2.54-2011-1x40GS(12of40)
designator P?, comment value 2011-1x40GS  (hidden comment: 2011-1x40GS(12of40))
Header SIL Male THP, 2.54mm Pitch; Manufacturer: Protronix; EDM-PN: CON12; Package: SIL12P-2.54; Text2: *; Text1: *; SAAB PN: *; Part Number: 2011-1x40GS(12of40)
footprint SIL12P-2.54 (SIL Strip 2.54mm)
pins: 1, 2, 3, 4, 5, 6, 7, 8, 9, 10, 11, 12

## SIL12PR-2.54
designator P?
Header SIL Male 2.54mm Rt Angle; Manufacturer: Various; Package: SIL12PR-2.54; EDM-PN: *; Text2: *; Text1: *; Part Number: SIL12PR-2.54; Value: SIL12PR-2.54; SAAB PN: *
footprint SIL12PR-2.54 (SIL Male Rt Angle THP Header, 2.54mm Pitch)
pins: 1, 2, 3, 4, 5, 6, 7, 8, 9, 10, 11, 12 9

## SIL12S-2.54
designator P?
Header SIL Female THP, 2.54mm Pitch; Manufacturer: Various; Package: SIL12S-2.54; EDM-PN: *; Text2: *; Text1: *; Value: SIL12S-2.54; Part Number: SIL12S-2.54; SAAB PN: *
footprint SIL12S-2.54 (SIL Female 2.54mm)
pins: 1, 2, 3, 4, 5, 6, 7, 8, 9, 10, 11, 12

## SIL12SR-2.54
designator P?
Header SIL Female THP, 2.54mm Pitch Rt Angle; Manufacturer: Various; Package: SIL12SR-2.54; EDM-PN: *; Text2: *; Text1: *; Value: SIL12SR-2.54; SAAB PN: *; Part Number: SIL12SR-2.54
footprint SIL12SR-2.54 (SIL12SR-2.54 2.54mm)
pins: 1, 2, 3, 4, 5, 6, 7, 8, 9, 10, 11, 12

## SIL13P-2.54
designator P?
Header SIL Male THP, 2.54mm Pitch; Manufacturer: Various; EDM-PN: CON12; Package: SIL13P-2.54; Text2: *; Text1: *; Value: SIL13P-2.54; SAAB PN: *; Part Number: SIL13P-2.54
footprint SIL13P-2.54 (SIL Strip 2.54mm)
pins: 1, 2, 3, 4, 5, 6, 7, 8, 9, 10, 11, 12, 13

## SIL13P-2.54-2011-1x40GS(13of40)
designator P?, comment value 2011-1x40GS  (hidden comment: 2011-1x40GS(13of40))
Header SIL Male THP, 2.54mm Pitch; Manufacturer: Protronix; EDM-PN: CON12; Package: SIL13P-2.54; Text2: *; Text1: *; SAAB PN: *; Part Number: 2011-1x40GS(13of40)
footprint SIL13P-2.54 (SIL Strip 2.54mm)
pins: 1, 2, 3, 4, 5, 6, 7, 8, 9, 10, 11, 12, 13

## SIL13PR-2.54
designator P?
Header SIL Male 2.54mm Rt Angle; Manufacturer: Various; Package: SIL13PR-2.54; EDM-PN: *; Text2: *; Text1: *; Part Number: SIL13PR-2.54; SAAB PN: *; Value: SIL13PR-2.54
footprint SIL13PR-2.54 (SIL Male Rt Angle THP Header, 2.54mm Pitch)
pins: 1, 2, 3, 4, 5, 6, 7, 8, 9, 10, 11, 12 9, 13 10

## SIL13S-2.54
designator P?
Header SIL Female THP, 2.54mm Pitch; Manufacturer: Various; Package: SIL13S-2.54; EDM-PN: *; Text2: *; Text1: *; Value: SIL13S-2.54; Part Number: SIL13S-2.54; SAAB PN: *
footprint SIL13S-2.54 (SIL Female 2.54mm)
pins: 1, 2, 3, 4, 5, 6, 7, 8, 9, 10, 11, 12, 13

## SIL14P-2.54
designator P?
Header SIL Male THP, 2.54mm Pitch; Manufacturer: Various; EDM-PN: CON12; Package: SIL14P-2.54; Text2: *; Text1: *; Value: SIL14P-2.54; SAAB PN: *; Part Number: SIL14P-2.54
footprint SIL14P-2.54 (SIL Strip 2.54mm)
pins: 1, 2, 3, 4, 5, 6, 7, 8, 9, 10, 11, 12, 13, 14

## SIL14P-2.54-2011-1x40GS(14of40)
designator P?, comment value 2011-1x40GS  (hidden comment: 2011-1x40GS(14of40))
Header SIL Male THP, 2.54mm Pitch; Manufacturer: Protronix; EDM-PN: CON12; Package: SIL14P-2.54; Text2: *; Text1: *; SAAB PN: *; Part Number: 2011-1x40GS(14of40)
footprint SIL14P-2.54 (SIL Strip 2.54mm)
pins: 1, 2, 3, 4, 5, 6, 7, 8, 9, 10, 11, 12, 13, 14

## SIL14PR-2.54
designator P?
Header SIL Male 2.54mm Rt Angle; Manufacturer: Various; Package: SIL14PR-2.54; EDM-PN: *; Text2: *; Text1: *; Part Number: SIL14PR-2.54; SAAB PN: *; Value: SIL14PR-2.54
footprint SIL14PR-2.54 (SIL Male Rt Angle THP Header, 2.54mm Pitch)
pins: 1, 2, 3, 4, 5, 6, 7, 8, 9, 10, 11, 12 9, 13 10, 14

## SIL14S-2.54
designator P?
Header SIL Female THP, 2.54mm Pitch; Manufacturer: Various; Package: SIL14S-2.54; EDM-PN: *; Text2: *; Text1: *; Value: SIL14S-2.54; Part Number: SIL14S-2.54; SAAB PN: *
footprint SIL14S-2.54 (SIL Female 2.54mm)
pins: 1, 2, 3, 4, 5, 6, 7, 8, 9, 10, 11, 12, 13, 14

## SIL15P-2.54
designator P?
Header SIL Male THP, 2.54mm Pitch; Manufacturer: Various; EDM-PN: CON12; Package: SIL15P-2.54; Text2: *; Text1: *; Value: SIL15P-2.54; SAAB PN: *; Part Number: SIL15P-2.54
footprint SIL15P-2.54 (SIL Strip 2.54mm)
pins: 1, 2, 3, 4, 5, 6, 7, 8, 9, 10, 11, 12, 13, 14, 15

## SIL15P-2.54-2011-1x40GS(15of40)
designator P?, comment value 2011-1x40GS  (hidden comment: 2011-1x40GS(15of40))
Header SIL Male THP, 2.54mm Pitch; Manufacturer: Protronix; EDM-PN: CON12; Package: SIL15P-2.54; Text2: *; Text1: *; SAAB PN: *; Part Number: 2011-1x40GS(15of40)
footprint SIL15P-2.54 (SIL Strip 2.54mm)
pins: 1, 2, 3, 4, 5, 6, 7, 8, 9, 10, 11, 12, 13, 14, 15

## SIL15S-2.54
designator P?
Header SIL Female THP, 2.54mm Pitch; Manufacturer: Various; Value: SIL15P-2.54; Package: SIL15S-2.54; EDM-PN: *; Text2: *; Text1: *; Part Number: SIL15S-2.54; SAAB PN: *
footprint SIL15S-2.54 (SIL Female 2.54mm)
pins: 1, 2, 3, 4, 5, 6, 7, 8, 9, 10, 11, 12, 13, 14, 15
